# Altium footprint library PRL_PDC.PcbLib: 77 footprints (part 2 of 5)
Each footprint in its own frame and in the unit in brackets; x right, y up, seen from the top. Pads: shape width x height; smd on the part's side, far side on the other; paste and mask are expansions set on the pad; w line width, h text height; cw(c..) or ccw(c..) is an arc to the next point about the centre after c.
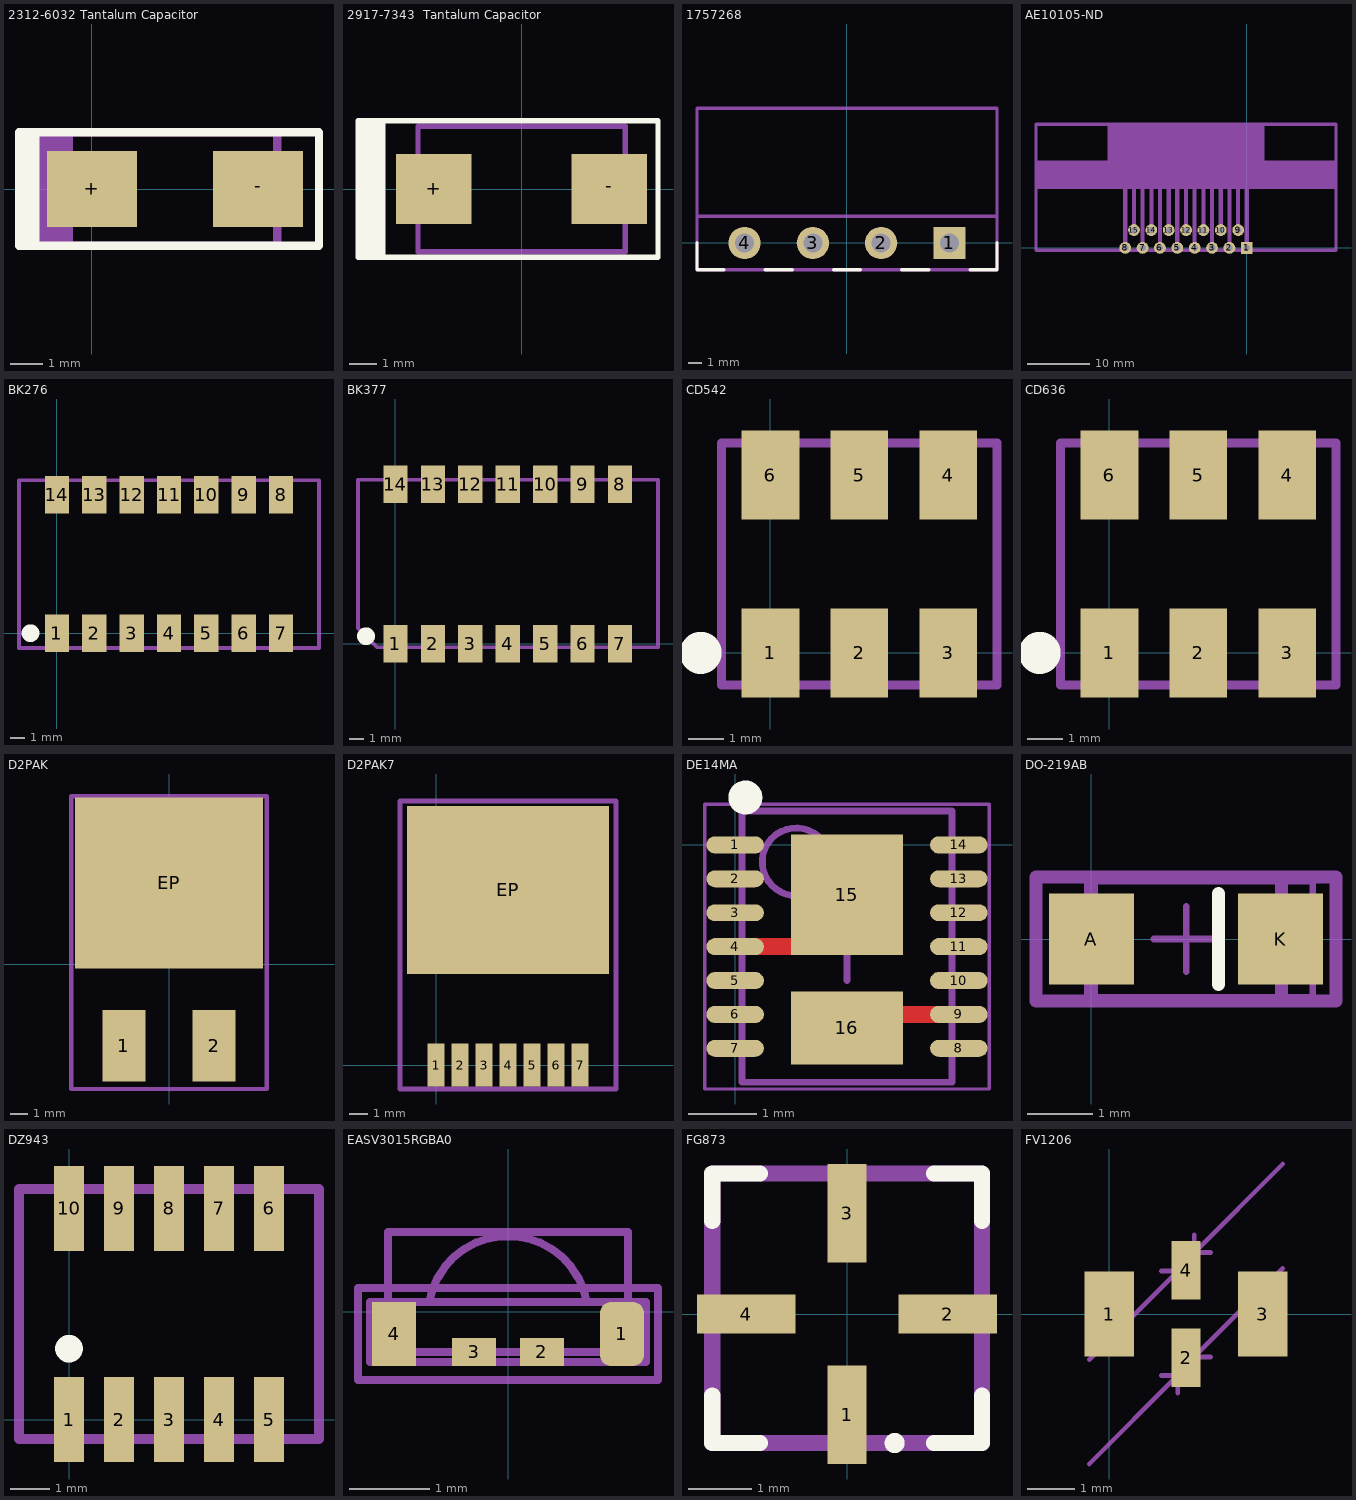
[diagram p1: the footprints below, top view; thin cyan lines are the x and y axes]

## 2312-6032 Tantalum Capacitor [mm]
height 3
pads (2):
  rect 2.77x2.35 smd paste-0.1: +(0,0) -(5.12,0)
Top Overlay:
  lines w0.254: -2,-1.75 -2,1.75 ; -1.75,-1.75 -1.75,1.75 ; -2.25,-1.75 -2.25,1.75 7,1.75 7,-1.75 -2.25,-1.75
Mechanical 1:
  rectangle: -2.25,-1.75 -0.59,1.75
  lines w0.254: -2.25,-1.75 -2.25,1.75 5.71,1.75 5.71,-1.75 -2.25,-1.75
3D body "T491C106K025AT.step": height 2.81, standoff 0, extent -0.59,-1.75 5.71,1.75

## 2917-7343  Tantalum Capacitor [mm]
height 3
pads (2):
  rect 2.77x2.55 smd paste-0.1: +(-3.22,0) -(3.22,0)
Top Overlay:
  rectangle: -6,-2.5 -5,2.5
  lines w0.2: -6,-2.5 5,-2.5 5,2.5 -6,2.5 -6,-2.5
Mechanical 1:
  lines w0.2: -3.8,-2.3 3.8,-2.3 3.8,2.3 -3.8,2.3 -3.8,-2.3
3D body "T491X157K020AT.step": height 4.31, standoff 0, extent -3.8,-2.3 3.8,2.3

## 1757268 [mm] "TERM BLOCK HDR 4POS 90DEG 5.08MM"
height 1
pads (4):
  rect 2.4x2.4 hole 1.4: 1(7.62,0)
  round 2.4 hole 1.4: 2(2.54,0) 3(-2.54,0) 4(-7.62,0)
Top Overlay:
  lines w0.25: -11.16,0.015 -11.16,-1.985 -9.16,-1.985 ; -6.08,-1.985 -4.08,-1.985 ; -1,-1.985 1,-1.985 ; 4.08,-1.985 6.08,-1.985 ; 9.16,-1.983 11.16,-1.983 ; 11.16,-1.985 11.16,0.015
Mechanical 1:
  lines w0.254: -11.16,-1.985 11.16,-1.985 11.16,10.017 -11.16,10.017 -11.16,-1.985
Mechanical 15:
  lines w0.254: -11.16,1.985 11.16,1.985 ; -11.16,-1.985 11.16,-1.985 11.16,10.017 -11.16,10.017 -11.16,-1.985
3D body "pxc_1757268_06_MSTBA-2-5-4-G-5-08_3D.stp": height 8.6, standoff -3.5, extent -11.16,-1.985 11.16,10.017

## AE10105-ND [mil] "15Position D-Sub Plug, Male Pins Connector"
height 433.07
pads (15):
  rect 74x74 hole 41.34: 1(0,0)
  round 74 hole 41.34: 2(-109,0) 3(-218,0) 4(-327,0) 5(-436,0) 6(-545,0) 7(-654,0) 8(-763,0) 9(-54,112) 10(-163,112) 11(-272,112) 12(-381,112) 13(-490,112) 14(-599,112) 15(-708,112)
Mechanical 1:
  rectangle: -873.13,540 111.13,776.22
  lines w20: -1322.83,380.75 559.06,380.75 ; -1322.83,538.98 559.06,538.98 ; -1322.83,-14.73 -1322.83,776.22 559.06,776.22 559.06,-14.73 -1322.83,-14.73
Mechanical 16:
  rectangle: -1322.83,380.75 559.94,538.98
  region: -823,270
  lines w26: -763,0 -763,393.7 ; -708,112 -708,426.96 ; -654,0 -654,393.7 ; -599,112 -599,426.96 ; -545,0 -545,393.7 ; -490,112 -490,426.96 ; -436,0 -436,393.7 ; -381,112 -381,426.96 ; -327,0 -327,393.7 ; -272,112 -272,426.96 ; -218,0 -218,393.7 ; -163,112 -163,426.96 ; -109,0 -109,393.7 ; -54,112 -54,426.96 ; 0,0 0,393.7
3D body "A-DF 15 AA-WP.stp": height 713.39, standoff -136.43, extent -1321.95,-14.73 559.94,776.22

## BK276 [mm] "Mini-circuits"
height 7
pads (14):
  rect 1.65x2.54 smd: 1(0,0) 2(2.54,0) 3(5.08,0) 4(7.62,0) 5(10.16,0) 6(12.7,0) 7(15.24,0) 8(15.24,9.4) 9(12.7,9.4) 10(10.16,9.4) 11(7.62,9.4) 12(5.08,9.4) 13(2.54,9.4) 14(0,9.4)
Top Overlay:
  circle w1: c-1.8,0 r0.1
Mechanical 1:
  lines w0.254: -2.58,-1.015 -2.58,10.4 17.82,10.4 17.82,-1.015 -2.58,-1.015
3D body: height 6.35, standoff 0, extent -2.58,-1.015 17.82,10.415

## BK377 [mm] "Mini-circuits"
height 7
pads (14):
  rect 1.65x2.54 smd: 1(0,0) 2(2.54,0) 3(5.08,0) 4(7.62,0) 5(10.16,0) 6(12.7,0) 7(15.24,0) 8(15.24,10.8) 9(12.7,10.8) 10(10.16,10.8) 11(7.62,10.8) 12(5.08,10.8) 13(2.54,10.8) 14(0,10.8)
Top Overlay:
  circle w1: c-2,0.5 r0.1
Mechanical 1:
  lines w0.254: -2.545,1.045 -2.545,11.115 17.82,11.115 17.82,-0.25 -1.25,-0.25 -2.545,1.045
3D body: height 6.35, standoff 0, extent -2.58,-0.315 17.82,11.115

## CD542 [mm] "Mini-Circuits CD542"
height 3
pads (6):
  rect 1.65x2.54 smd: 1(0,0) 2(2.54,0) 3(5.08,0) 4(5.08,5.08) 5(2.54,5.08) 6(0,5.08)
Top Overlay:
  circle w1: c-2,0 r0.1
Mechanical 1:
  lines w0.254: -1.395,-0.915 -1.395,5.995 6.475,5.995 6.475,-0.915 -1.395,-0.915
3D body "User Library-CD542.step": height 2.85, standoff 0, extent -1.395,-0.915 6.475,5.995

## CD636 [mm] "Mini-Circuits CD636"
height 4.5
pads (6):
  rect 1.65x2.54 smd: 1(0,0) 2(2.54,0) 3(5.08,0) 4(5.08,5.08) 5(2.54,5.08) 6(0,5.08)
Top Overlay:
  circle w1: c-2,0 r0.1
Mechanical 1:
  lines w0.254: -1.395,-0.915 6.475,-0.915 6.475,5.995 -1.395,5.995 -1.395,-0.915
3D body "User Library-CD636-1.step": height 4.11, standoff 0, extent -1.335,-0.85 6.535,6.05

## D2PAK [mm] "TO-263-3, D²Pak (2 Leads + Tab), TO-263AB"
height 5
pads (3):
  rect 2.5x4.2 smd paste-0.1: 1(-2.64,-4.763) 2(2.64,-4.763)
  rect 11x10 smd paste-0.1: EP(0,4.763)
Mechanical 1:
  lines w0.254: -5.715,-7.302 -5.715,9.842 5.715,9.842 5.715,-7.302 -5.715,-7.302
3D body "D2PAK2.step": height 4.98, standoff -0.03, extent -5.08,-5.924 5.08,9.34

## D2PAK7 [mil] "R Package  7-Lead Plastic DD Pak"
height 196.85
pads (8):
  rect 35x90 smd paste-3.94: 1(0,0) 2(50,0) 3(100,0) 4(150,0) 5(200,0) 6(250,0) 7(300,0)
  rect 420x350 smd paste-3.94: EP(150,365)
Mechanical 1:
  lines w10: -75,-50 375,-50 375,550 -75,550 -75,-50
3D body "D2Pak7.STEP": height 195.3, standoff 6.33, extent -46.84,-46.45 346.86,570.48

## DE14MA [mm]
height 0.8
pads (16):
  oval 0.85x0.25 smd: 1(0,0) 2(0,-0.5) 3(0,-1) 4(0,-1.5) 5(0,-2) 6(0,-2.5) 7(0,-3) 8(3.3,-3) 9(3.3,-2.5) 10(3.3,-2) 11(3.3,-1.5) 12(3.3,-1) 13(3.3,-0.5) 14(3.3,0)
  rect 1.65x1.78 smd: 15(1.65,-0.735)
  rect 1.65x1.07 smd: 16(1.65,-2.7)
Top Layer:
  lines w0.25: 0,-1.5 1.35,-1.5 ; 1.95,-2.5 3.3,-2.5
Top Overlay:
  circle w0.25: c0.15,0.7 r0.125
Mechanical 13:
  circle w0.1: c0.9,-0.25 r0.5
  lines w0.1: 0.1,-3.5 3.2,-3.5 3.2,0.5 0.1,0.5 0.1,-3.5
Mechanical 15:
  lines w0.05: -0.45,-3.6 3.75,-3.6 3.75,0.6 -0.45,0.6 -0.45,-3.6
  lines w0.1: 1.15,-1.5 2.15,-1.5 ; 1.65,-2 1.65,-1
3D body "DFN-14_DE.step": height 0.8, standoff 0, extent 0.049,-3.55 3.251,0.55

## DO-219AB [mm] "DO-219AB"
height 1
pads (2):
  rect 1.3x1.4 smd: A(0,0) K(2.9,0)
Top Overlay:
  lines w0.2: 1.95,-0.7 1.95,0.7
Mechanical 1:
  lines w0.2: 0,-0.95 0,0.95 2.911,0.95 2.911,-0.95 0,-0.95
Mechanical 15:
  lines w0.1: 0.956,0 1.956,0 ; 1.456,-0.5 1.456,0.5
  lines w0.2: -0.85,-0.95 3.75,-0.95 3.75,0.95 -0.85,0.95 -0.85,-0.95
Mechanical 30:
  lines w0.1: -0.064,-0.892 -0.064,0.889 3.391,0.889 3.391,-0.892 -0.064,-0.892
  text ".Designator" at -0.311,-0.425 h0.8
Mechanical 31:
  lines w0.1: -0.064,-0.892 -0.064,0.889 3.391,0.889 3.391,-0.892 -0.064,-0.892
  text ".Comment" at -0.361,-0.45 h0.8
3D body: height 1, standoff 0.1, extent 0,-0.95 2.911,0.95
3D body: height 1.01, standoff 0.12, extent 2.15,-0.975 2.35,0.975
3D body: height 0.5, standoff 0.11, extent -0.294,-0.3 3.206,0.3

## DZ943 [mm] "Minicircuits"
height 5
pads (10):
  rect 0.76x2.16 smd: 1(0,0) 2(1.27,0) 3(2.54,0) 4(3.81,0) 5(5.08,0) 6(5.08,5.36) 7(3.81,5.36) 8(2.54,5.36) 9(1.27,5.36) 10(0,5.36)
Top Overlay:
  circle w0.5: c0,1.8 r0.1
Mechanical 1:
  lines w0.254: -1.27,-0.495 6.35,-0.495 6.35,5.855 -1.27,5.855 -1.27,-0.495
3D body: height 0.25, standoff 0, extent 7,4 7,4
3D body: height 0.25, standoff 0, extent 8,4 8,4
3D body: height 0.25, standoff 0, extent 8,5 8,5
3D body: height 4.83, standoff 0, extent -1.27,-0.495 6.35,5.855

## EASV3015RGBA0 [mm] "LED RGB CLEAR 4SMD R/A"
height 3
pads (4):
  rrect50% 0.55x0.8 smd: 1(1.425,-0.275)
  rect 0.55x0.35 smd paste-0.1: 2(0.425,-0.5) 3(-0.425,-0.5)
  rect 0.55x0.8 smd: 4(-1.425,-0.275)
Mechanical 1:
  lines w0.1: -1.5,-0.5 -1.5,1 1.5,1 1.5,-0.5 -1.5,-0.5
Mechanical 15:
  lines w0.1: -1.875,-0.85 1.875,-0.85 1.875,0.3 -1.875,0.3 -1.875,-0.85
Mechanical 16:
  lines w0.1: -0.985,0.124 cw(c0,-0.05) 0.985,0.124 ; -1.725,-0.625 -1.725,0.125 1.725,0.125 1.725,-0.625 -1.725,-0.625
3D body "EASV3015RGBA0.STEP": height 1, standoff 0, extent -1.5,-0.5 1.5,1

## FG873 [mm] "Minicircuits FG873"
height 1
pads (4):
  rect 0.61x1.55 smd paste-0.1: 1(0,-1.585) 3(0,1.585)
  rect 1.55x0.61 smd paste-0.1: 2(1.585,0) 4(-1.585,0)
Top Overlay:
  circle w0.254: c0.75,-2.03 r0.03
  lines w0.254: -2.121,-1.28 -2.121,-2.03 -1.371,-2.03 ; -2.121,1.463 -2.121,2.213 -1.371,2.213 ; 1.371,-2.03 2.121,-2.03 2.121,-1.28 ; 1.371,2.213 2.121,2.213 2.121,1.463
Mechanical 1:
  lines w0.254: -2.121,-2.03 -2.121,2.213 2.121,2.213 2.121,-2.03 -2.121,-2.03
3D body "FG873.step": height 0.9, standoff 0, extent -2.121,-2.03 2.121,2.213

## FV1206 [mm] "Chip ceramic LTCC filter"
height 2
pads (4):
  rect 1.04x1.8 smd: 1(0,0) 3(3.25,0)
  rect 0.61x1.245 smd: 2(1.625,-0.927) 4(1.625,0.927)
Mechanical 15:
  circle w0.3: c1.625,-1.105 r0
  circle w0.3: c1.625,1.105 r0
  lines w0.1: -0.425,-3.175 1.45,-1.3 ; -0.425,-0.965 1.45,0.91 ; 1.1,-1.3 1.45,-1.3 ; 1.1,0.91 1.45,0.91 ; 1.45,-1.675 1.45,-1.3 ; 1.45,0.535 1.45,0.91 ; 1.8,-0.535 1.8,-0.91 ; 1.8,1.675 1.8,1.3 ; 2.15,-0.91 1.8,-0.91 ; 2.15,1.3 1.8,1.3 ; 3.675,0.965 1.8,-0.91 ; 3.675,3.175 1.8,1.3
  text "PTH!" at 4.013,2.565 h1
  text "PTH!" at 4.013,0.355 h1
Mechanical 30:
  text ".Designator" at -1.975,-0.425 h0.8
Mechanical 31:
  text ".Comment" at -2.025,-0.45 h0.8
3D body "User Library-FV1206-1.step": height 0.92, standoff -0.03, extent 0.025,-0.83 3.225,0.83